# Altium footprint library BaseBoard.PcbLib: 128 footprints (part 4 of 8)
Each footprint in its own frame and in the unit in brackets; x right, y up, seen from the top. Pads: shape width x height; smd on the part's side, far side on the other; paste and mask are expansions set on the pad; w line width, h text height; cw(c..) or ccw(c..) is an arc to the next point about the centre after c.
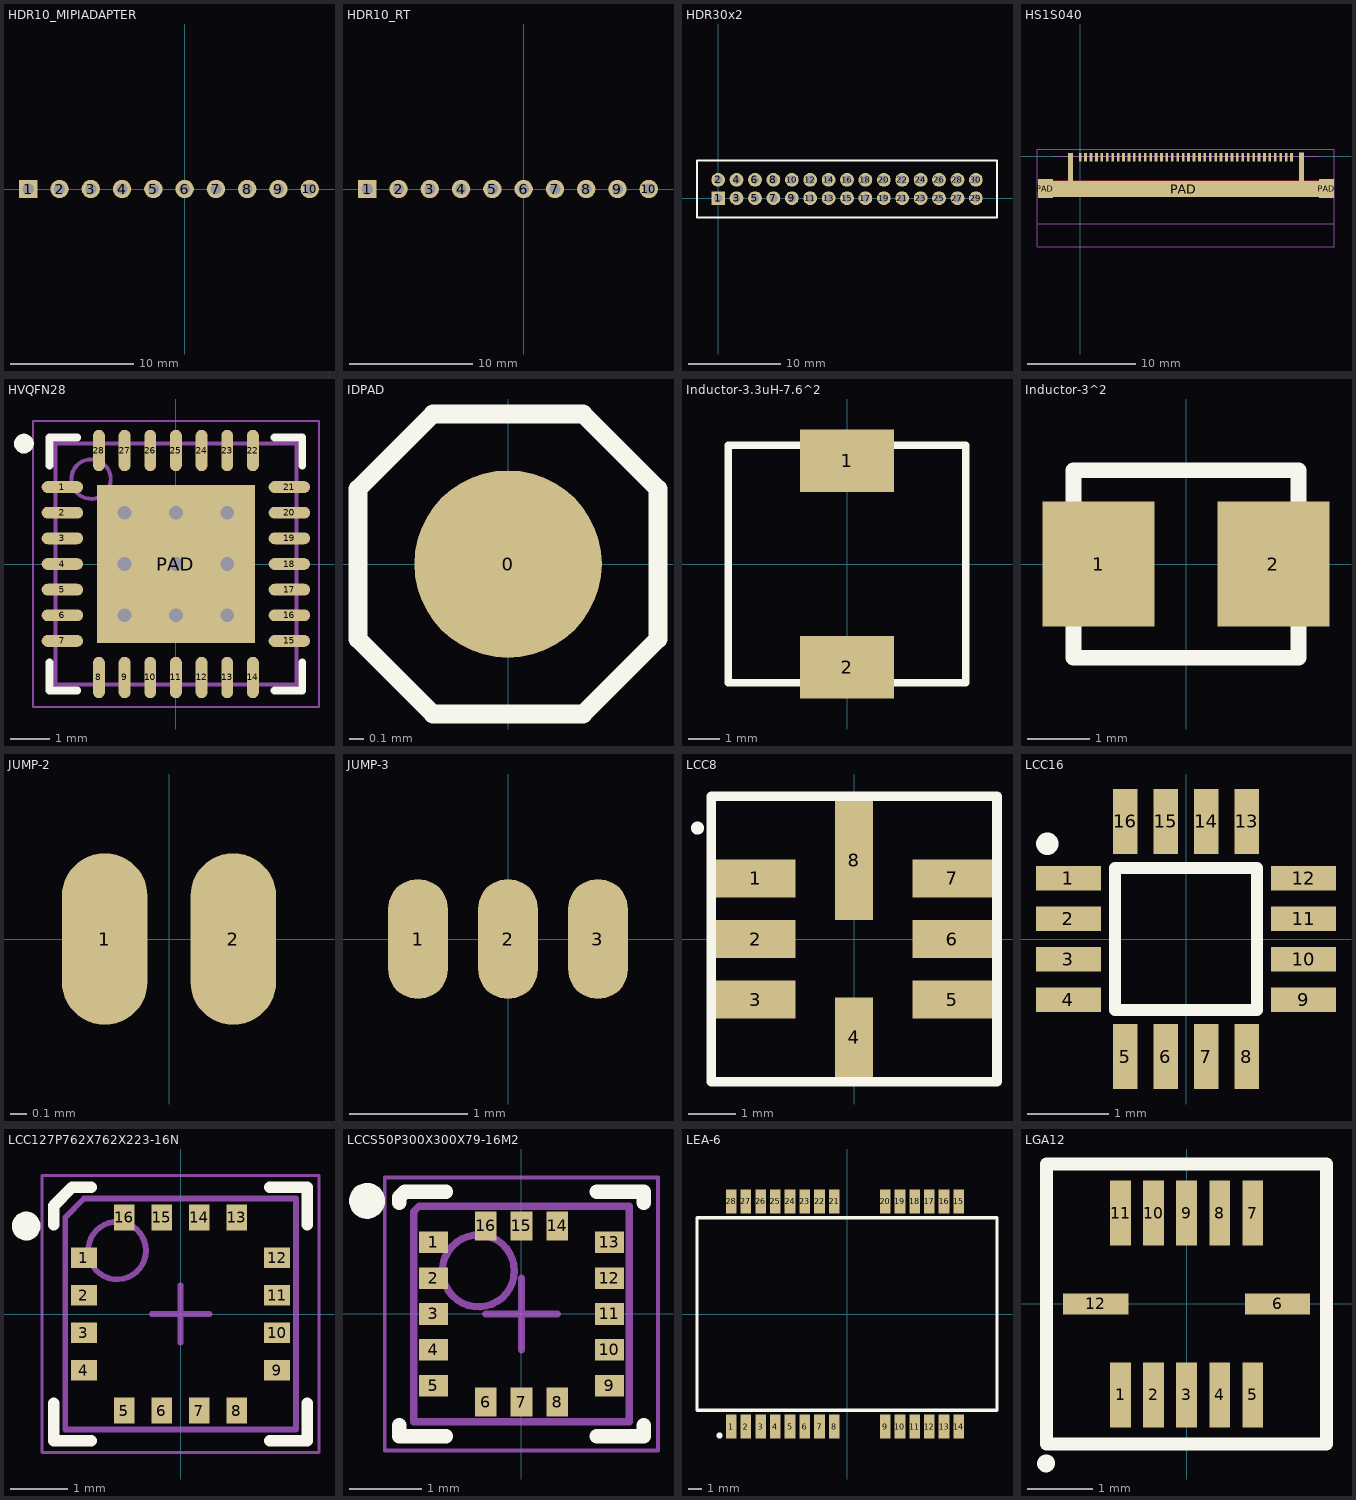
[diagram p3: the footprints below, top view; thin cyan lines are the x and y axes]

## HDR10_MIPIADAPTER [mm] "MIPI adapter board"
pads (10):
  rect 1.5x1.5 hole 0.9: 1(-12.7,0)
  round 1.5 hole 0.9: 2(-10.16,0) 3(-7.62,0) 4(-5.08,0) 5(-2.54,0) 6(0,0) 7(2.54,0) 8(5.08,0) 9(7.62,0) 10(10.16,0)
3D body "MIPIAdapter.step": height 3.98, standoff 2.61, extent -16.2,-10 13.8,5

## HDR10_RT [mm] "10 pin right angle header 2.54"
pads (10):
  rect 1.5x1.5 hole 0.9: 1(-12.7,0)
  round 1.5 hole 0.9: 2(-10.16,0) 3(-7.62,0) 4(-5.08,0) 5(-2.54,0) 6(0,0) 7(2.54,0) 8(5.08,0) 9(7.62,0) 10(10.16,0)
3D body "Samtec-TSW-110-08-G-S-RA.step": height 3.27, standoff -2.06, extent -13.975,-9.899 11.425,0.325

## HDR30x2 [mm] "30pin IDC header 2mm"
pads (30):
  rect 1.5x1.5 hole 0.9: 1(0,0)
  round 1.5 hole 0.9: 2(0,2) 3(2,0) 4(2,2) 5(4,0) 6(4,2) 7(6,0) 8(6,2) 9(8,0) 10(8,2) 11(10,0) 12(10,2) 13(12,0) 14(12,2) 15(14,0) 16(14,2) 17(16,0) 18(16,2) 19(18,0) 20(18,2) 21(20,0) 22(20,2) 23(22,0) 24(22,2) 25(24,0) 26(24,2) 27(26,0) 28(26,2) 29(28,0) 30(28,2)
Top Overlay:
  lines w0.254: -2.3,-2.1 30.3,-2.1 30.3,4.1 -2.3,4.1 -2.3,-2.1
3D body "878313020.stp": height 6.4, standoff -2.5, extent -2.35,-2.15 30.3,4.15

## HS1S040 [mm] "JAE HS1S040 MIPI connector"
pads (45):
  rect 0.25x0.8 smd: 1(0,-0.1) 2(0.5,-0.1) 3(1,-0.1) 4(1.5,-0.1) 5(2,-0.1) 6(2.5,-0.1) 7(3,-0.1) 8(3.5,-0.1) 9(4,-0.1) 10(4.5,-0.1) 11(5,-0.1) 12(5.5,-0.1) 13(6,-0.1) 14(6.5,-0.1) 15(7,-0.1) 16(7.5,-0.1) 17(8,-0.1) 18(8.5,-0.1) 19(9,-0.1) 20(9.5,-0.1) 21(10,-0.1) 22(10.5,-0.1) 23(11,-0.1) 24(11.5,-0.1) 25(12,-0.1) 26(12.5,-0.1) 27(13,-0.1) 28(13.5,-0.1) 29(14,-0.1) 30(14.5,-0.1) 31(15,-0.1) 32(15.5,-0.1) 33(16,-0.1) 34(16.5,-0.1) 35(17,-0.1) 36(17.5,-0.1) 37(18,-0.1) 38(18.5,-0.1) 39(19,-0.1) 40(19.5,-0.1)
  rect 1.4x1.75 smd: PAD(-3.2,-3) PAD(22.725,-3)
  rect 0.45x3 smd: PAD(-0.9,-1.2) PAD(20.4,-1.175)
  rect 25x1.5 smd: PAD(9.55,-3.025)
Top Layer:
  rectangle: -3.125,-3.75 23.025,-2.25
Mechanical 13:
  lines w0.1: -2.5,-0.025 22,-0.025
Mechanical 15:
  lines w0.1: -3.975,0.625 -3.975,-8.375 23.425,-8.375 23.425,0.625 ; -3.975,0.625 -3.975,-6.225 23.425,-6.225 23.425,0.625 ; -3.975,0.625 23.425,0.625
3D body "K3D-HD1S040HA1_v01_JAE_Proprietary.STEP": height 0.98, standoff -0.05, extent -3.375,-3.975 22.875,-0.025

## HVQFN28 [mm] "QFN, 28-Leads, Body 6.00x6.00mm, Pitch 0.65mm, Thermal Pad 4.10x4.10mm, IPC Medium Density"
height 1
pads (29):
  oval 1.05x0.3 smd: 1(-2.875,1.95) 2(-2.875,1.3) 3(-2.875,0.65) 4(-2.875,0) 5(-2.875,-0.65) 6(-2.875,-1.3) 7(-2.875,-1.95) 15(2.875,-1.95) 16(2.875,-1.3) 17(2.875,-0.65) 18(2.875,0) 19(2.875,0.65) 20(2.875,1.3) 21(2.875,1.95)
  oval 0.3x1.05 smd: 8(-1.95,-2.875) 9(-1.3,-2.875) 10(-0.65,-2.875) 11(0,-2.875) 12(0.65,-2.875) 13(1.3,-2.875) 14(1.95,-2.875) 22(1.95,2.875) 23(1.3,2.875) 24(0.65,2.875) 25(0,2.875) 26(-0.65,2.875) 27(-1.3,2.875) 28(-1.95,2.875)
  rect 4x4 smd: PAD(0,0)
via 0,1.3 diameter 0.7 hole 0.35
via 1.3,0 diameter 0.7 hole 0.35
via 0,0 diameter 0.7 hole 0.35
via 1.3,-1.3 diameter 0.7 hole 0.35
via 0,-1.3 diameter 0.7 hole 0.35
via -1.3,-1.3 diameter 0.7 hole 0.35
via -1.3,0 diameter 0.7 hole 0.35
via 1.3,1.3 diameter 0.7 hole 0.35
via -1.3,1.3 diameter 0.7 hole 0.35
Top Overlay:
  circle w0.25: c-3.85,3.05 r0.125
  lines w0.2: -3.2,-2.5 -3.2,-3.2 -2.5,-3.2 ; -3.2,2.5 -3.2,3.2 -2.5,3.2 ; 2.5,-3.2 3.2,-3.2 3.2,-2.5 ; 2.5,3.2 3.2,3.2 3.2,2.5
Mechanical 13:
  circle w0.1: c-2.15,2.15 r0.5
  lines w0.1: -3.05,-3.05 -3.05,3.05 3.05,3.05 3.05,-3.05 -3.05,-3.05
Mechanical 15:
  lines w0.05: -3.625,-3.625 -3.625,3.625 3.625,3.625 3.625,-3.625 -3.625,-3.625
  lines w0.1: -0.5,0 0.5,0 ; 0,-0.5 0,0.5
3D body: height 1, standoff 0.05, extent -3.05,-3.05 3.05,3.05

## IDPAD [mm]
pads (1):
  round 1.27 smd: 0(0,0)
Top Overlay:
  lines w0.127: -1.016,-0.508 -0.508,-1.016 0.508,-1.016 1.016,-0.508 1.016,0.508 0.508,1.016 -0.508,1.016 -1.016,0.508 -1.016,-0.508

## Inductor-3.3uH-7.6^2 [mm]
pads (2):
  rect 3x2 smd: 1(0,3.3) 2(0,-3.3)
Top Overlay:
  lines w0.254: -3.8,-3.8 3.8,-3.8 3.8,3.8 -3.8,3.8 -3.8,-3.8

## Inductor-3^2 [mm] "IHLP-1212BZ-11, Manu: VISHAY"
height 1.8
pads (2):
  rect 1.8x2 smd: 1(-1.4,0) 2(1.4,0)
Top Overlay:
  lines w0.254: -1.8,-1.5 -1.8,1.5 1.8,1.5 1.8,-1.5 -1.8,-1.5

## JUMP-2 [mil]
pads (2):
  oval 20x40 smd: 1(-15,0) 2(15,0)

## JUMP-3 [mil]
pads (3):
  oval 20x40 smd: 1(-30,0) 2(0,0) 3(30,0)

## LCC8 [mm]
pads (8):
  rect 1.67x0.8 smd: 1(-2.065,1.27) 2(-2.065,0) 3(-2.065,-1.27) 5(2.065,-1.27) 6(2.065,0) 7(2.065,1.27)
  rect 0.8x1.67 smd: 4(0,-2.065)
  rect 0.8x2.5 smd: 8(0,1.65)
Top Overlay:
  circle w0.254: c-3.285,2.325 r0.01
  lines w0.2: -3,-3 -3,3 3,3 3,-3 -3,-3

## LCC16 [mm]
pads (16):
  rect 0.8x0.3 smd: 1(-1.45,0.75) 2(-1.45,0.25) 3(-1.45,-0.25) 4(-1.45,-0.75) 9(1.45,-0.75) 10(1.45,-0.25) 11(1.45,0.25) 12(1.45,0.75)
  rect 0.3x0.8 smd: 5(-0.75,-1.45) 6(-0.25,-1.45) 7(0.25,-1.45) 8(0.75,-1.45) 13(0.75,1.45) 14(0.25,1.45) 15(-0.25,1.45) 16(-0.75,1.45)
Top Overlay:
  circle w0.254: c-1.71,1.175 r0.01
  lines w0.152: -0.875,-0.875 0.875,-0.875 0.875,0.875 -0.875,0.875 -0.875,-0.875

## LCC127P762X762X223-16N [mm]
height 1
pads (16):
  rect 0.45x0.35 smd: 1(-1.675,0.975) 2(-1.675,0.325) 3(-1.675,-0.325) 4(-1.675,-0.975) 9(1.675,-0.975) 10(1.675,-0.325) 11(1.675,0.325) 12(1.675,0.975)
  rect 0.35x0.45 smd: 5(-0.975,-1.675) 6(-0.325,-1.675) 7(0.325,-1.675) 8(0.975,-1.675) 13(0.975,1.675) 14(0.325,1.675) 15(-0.325,1.675) 16(-0.975,1.675)
Top Overlay:
  circle w0.25: c-2.675,1.525 r0.125
  lines w0.2: -2.2,-1.55 -2.2,-2.2 -1.55,-2.2 ; -2.2,1.55 -2.2,1.875 -1.875,2.2 -1.55,2.2 ; 1.55,-2.2 2.2,-2.2 2.2,-1.55 ; 1.55,2.2 2.2,2.2 2.2,1.55
Mechanical 13:
  circle w0.1: c-1.1,1.1 r0.5
  lines w0.1: -2,-2 -2,1.675 -1.675,2 2,2 2,-2 -2,-2
Mechanical 15:
  lines w0.05: -2.4,-2.4 -2.4,2.4 2.4,2.4 2.4,-2.4 -2.4,-2.4
  lines w0.1: -0.5,0 0.5,0 ; 0,-0.5 0,0.5
3D body: height 1, standoff 0, extent -2,-2 2,2

## LCCS50P300X300X79-16M2 [mm] "LCC, 16-Pins, Body 3.00x3.00mmx0.79mm, Pitch 0.50mm, IPC Low Density"
height 0.79
pads (16):
  rect 0.4x0.3 smd: 1(-1.225,1) 2(-1.225,0.5) 3(-1.225,0) 4(-1.225,-0.5) 5(-1.225,-1) 9(1.225,-1) 10(1.225,-0.5) 11(1.225,0) 12(1.225,0.5) 13(1.225,1)
  rect 0.3x0.4 smd: 6(-0.5,-1.225) 7(0,-1.225) 8(0.5,-1.225) 14(0.5,1.225) 15(0,1.225) 16(-0.5,1.225)
Top Overlay:
  circle w0.25: c-2.15,1.575 r0.125
  lines w0.2: -1.7,-1.55 -1.7,-1.7 -1.05,-1.7 ; -1.7,1.55 -1.7,1.625 -1.625,1.7 -1.05,1.7 ; 1.05,-1.7 1.7,-1.7 1.7,-1.55 ; 1.05,1.7 1.7,1.7 1.7,1.55
Mechanical 13:
  circle w0.1: c-0.6,0.6 r0.5
  lines w0.1: -1.5,-1.5 1.5,-1.5 1.5,1.5 -1.425,1.5 -1.5,1.425 -1.5,-1.5
Mechanical 15:
  lines w0.05: -1.9,-1.9 1.9,-1.9 1.9,1.9 -1.9,1.9 -1.9,-1.9
  lines w0.1: -0.5,0 0.5,0 ; 0,-0.5 0,0.5
3D body: height 0.79, standoff 0, extent -1.5,-1.5 1.5,1.5

## LEA-6 [mm]
pads (28):
  rect 0.8x1.8 smd: 1(-8.65,-8.4) 2(-7.55,-8.4) 3(-6.45,-8.4) 4(-5.35,-8.4) 5(-4.25,-8.4) 6(-3.15,-8.4) 7(-2.05,-8.4) 8(-0.95,-8.4) 9(2.85,-8.4) 10(3.95,-8.4) 11(5.05,-8.4) 12(6.15,-8.4) 13(7.25,-8.4) 14(8.35,-8.4) 15(8.35,8.4) 16(7.25,8.4) 17(6.15,8.4) 18(5.05,8.4) 19(3.95,8.4) 20(2.85,8.4) 21(-0.95,8.4) 22(-2.05,8.4) 23(-3.15,8.4) 24(-4.25,8.4) 25(-5.35,8.4) 26(-6.45,8.4) 27(-7.55,8.4) 28(-8.65,8.4)
Top Overlay:
  circle w0.254: c-9.525,-9.075 r0.1
  lines w0.254: -11.2,-7.2 11.2,-7.2 11.2,7.2 -11.2,7.2 -11.2,-7.2

## LGA12 [mm]
pads (12):
  rect 0.32x1 smd: 1(-1.016,-1.397) 2(-0.508,-1.397) 3(0,-1.397) 4(0.508,-1.397) 5(1.016,-1.397) 7(1.016,1.397) 8(0.508,1.397) 9(0,1.397) 10(-0.508,1.397) 11(-1.016,1.397)
  rect 1x0.32 smd: 6(1.397,0) 12(-1.397,0)
Top Overlay:
  circle w0.254: c-2.16,-2.45 r0.01
  lines w0.2: -2.15,-2.15 2.15,-2.15 2.15,2.15 -2.15,2.15 -2.15,-2.15